# Altium schematic symbol library mastermind.SCHLIB: 732 symbols (part 2 of 5)
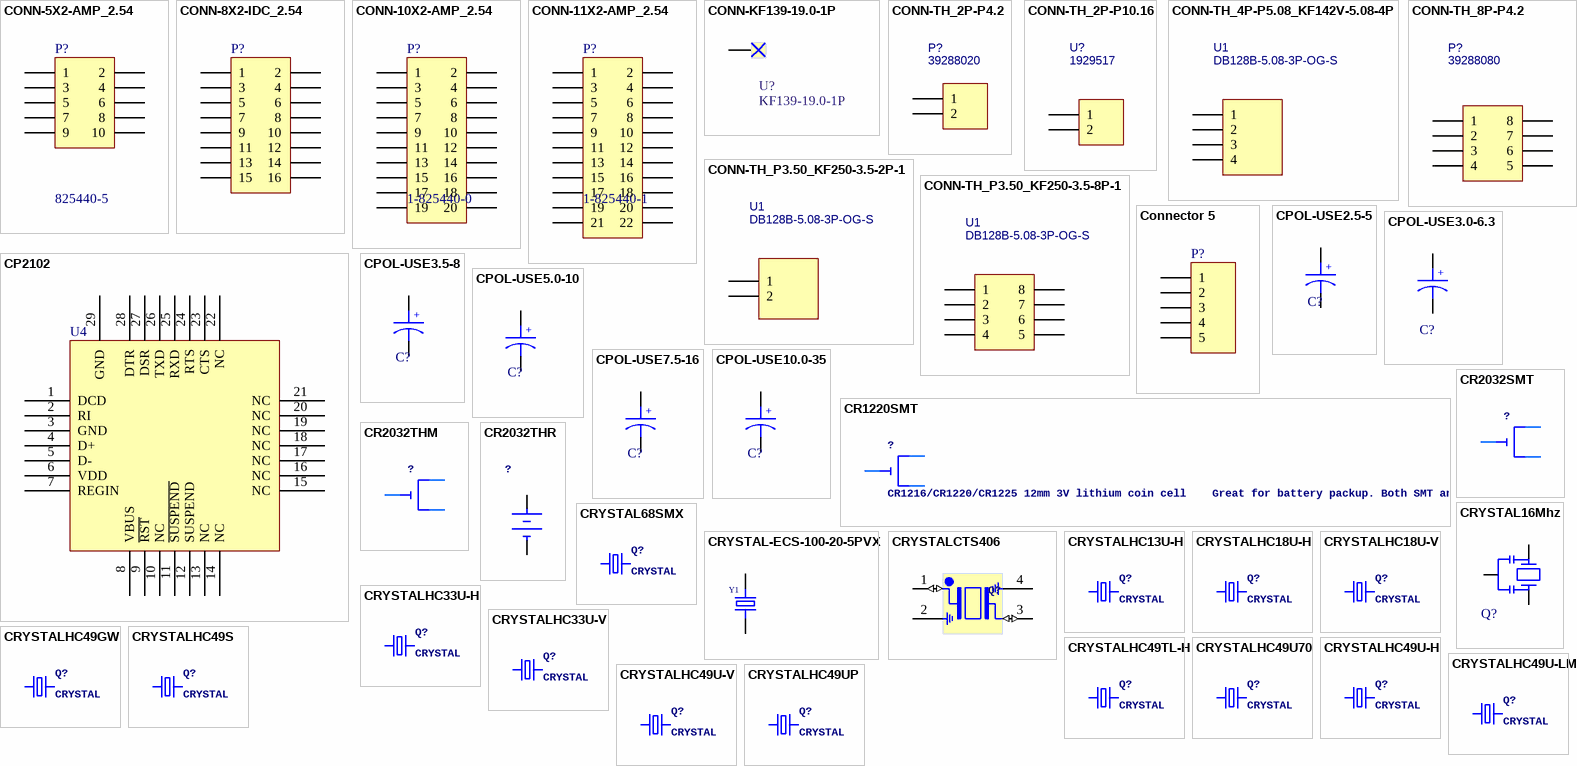
[diagram p35: symbols CONN-5X2-AMP_2.54 to CRYSTALHC49UP]

## CONN-TH_4P-P5.08_KF142V-5.08-4P
designator U1, comment DB128B-5.08-3P-OG-S
BOM_Manufacturer: DIBO; Contributor: LCSC; BOM_Supplier: LCSC; BOM_Supplier Part: C500034; BOM_Manufacturer Part: DB128B-5.08-3P-OG-S; BOM_JLCPCB Part Class: Extended Part; spicePre: U; spiceSymbolName: DB128B-5.08-3P-OG-S
footprint CONN-TH_4P-P5.08_KF142V-5.08-4P
pins: 1, 2, 3, 4

## CONN-TH_8P-P4.2
designator P?, comment 39288080
Molex POW CONN; Contributor: LCSC; Supplier: LCSC; Supplier Part: C505059; Manufacturer: MOLEX; Manufacturer Part: 39288080; JLCPCB Part Class: Extended Part; spicePre: C; spiceSymbolName: 39288080
footprint CONN-TH_39288080
pins: 1, 2, 3, 4, 5, 6, 7, 8

## CONN-TH_P3.50_KF250-3.5-2P-1
designator U1, comment DB128B-5.08-3P-OG-S
BOM_Manufacturer: DIBO; Contributor: LCSC; BOM_Supplier: LCSC; BOM_Supplier Part: C500034; BOM_Manufacturer Part: DB128B-5.08-3P-OG-S; BOM_JLCPCB Part Class: Extended Part; spicePre: U; spiceSymbolName: DB128B-5.08-3P-OG-S
footprint CONN-TH_P3.50_KF250-3.5-2P-1
pins: 1, 2

## CONN-TH_P3.50_KF250-3.5-8P-1
designator U1, comment DB128B-5.08-3P-OG-S
BOM_Manufacturer: DIBO; Contributor: LCSC; BOM_Supplier: LCSC; BOM_Supplier Part: C500034; BOM_Manufacturer Part: DB128B-5.08-3P-OG-S; BOM_JLCPCB Part Class: Extended Part; spicePre: U; spiceSymbolName: DB128B-5.08-3P-OG-S
footprint CONN-TH_8P-P2.54_KF141V-2.54-8P
pins: 1, 2, 3, 4, 5, 6, 7, 8

## Connector 5
designator P?
XH Header Male Pin 0.100; LatestRevisionDate: 17-Jul-2002; LatestRevisionNote: Re-released for DXP Platform.; Publisher: Altium Limited; JLCPCB#: C146121
signal-integrity model Connector
footprint JST-5-PTH-KIT
footprint JST-5-PTH-ST
footprint JST-5-PTH-KIT - SMD
pins: 1, 2, 3, 4, 5

## CP2102
designator U4
CP2102
footprint QFN28
pins: 1 DCD, 2 RI, 3 GND, 4 D+, 5 D-, 6 VDD, 7 REGIN, 8 VBUS, 9 ~{RST}, 10 NC, 11 ~{SUSPEND}, 12 SUSPEND, 13 NC, 14 NC, 15 NC, 16 NC, 17 NC, 18 NC, 19 NC, 20 NC, 21 NC, 22 NC, 23 CTS, 24 RTS, 25 RXD, 26 TXD, 27 DSR, 28 DTR, 29 GND

## CPOL-USE2.5-5
designator C?, comment 47uF  (value not drawn)
footprint E2,5-5
pins: +, -

## CPOL-USE3.0-6.3
designator C?, comment 47uF  (value not drawn)
footprint E2,5-6.3
pins: +, -

## CPOL-USE3.5-8
designator C?, comment 1000Uf  (value not drawn)
footprint E3,5-8
footprint E3,17-8 -NoOutline
pins: +, -

## CPOL-USE5.0-10
designator C?, comment 10uF  (value not drawn)
footprint E3,5-10
pins: +, -

## CPOL-USE7.5-16
designator C?, comment 10uF  (value not drawn)
footprint E7.5-16
pins: +, -

## CPOL-USE10.0-35
designator C?, comment 10uF  (value not drawn)
footprint E10-35
footprint E10-35-Generic
pins: +, -

## CR1220SMT
designator ?, comment CR1216/CR1220/CR1225 12mm 3V lithium coin cell    Great for battery packup. Both SMT and THM holders.  Note the THM package has the ground pads on both sides of the PCB so that the masks are the same - this reduces the cost
footprint CR1220-SMD
pins: +$1 +, +$2 +1, -

## CR2032SMT
designator ?
footprint CR2032-SMD
pins: +$1 +, +$2 +1, -

## CR2032THM
designator ?
footprint CR2032-THRU
footprint CR2032_HOLDER_SMD
pins: +, +, -

## CR2032THR
designator ?
footprint CR2032_HOLDER_SMD
footprint CR2032-THRUHOLE
pins: +, -

## CRYSTAL16Mhz
designator Q?, comment 16MHz  (value not drawn)
Crystal Osscilator; OC_FARNELL: unknown; OC_NEWARK: unknown
footprint CSTCE16M 3215
pins: 1, 2, 3

## CRYSTAL68SMX
designator Q?, comment CRYSTAL
OC_FARNELL: 6344860; OC_NEWARK: unknown
footprint 86SMX
pins: 1, 4 2

## CRYSTAL-ECS-100-20-5PVX
designator Y1, comment crystal  (value not drawn)
10MHz Â±30ppm Crystal 20pF 60 Ohms HC-49/US; MP: ECS-100-20-5PVX; MF: ECS Inc.; Availability: Warning; SnapEDA_Link: https://www.snapeda.com/parts/ECS-100-20-5PVX/ECS%20Inc./view-part/2721546/?ref=snap; Value: *; Price: None; Package: HC49/US ECS International; Check_prices: https://www.snapeda.com/parts/ECS-100-20-5PVX/ECS%20Inc./view-part/2721546/?ref=eda
footprint HC-49US_L11.5-W4.5-P4.88
footprint OSC-SMD_2P-L5.0-W3.2
footprint XTAL1
pins: 1, 2

## CRYSTALCTS406
designator Q?, comment CRYSTAL  (value not drawn)
CRYSTALCTS406; OC_FARNELL: unknown; OC_NEWARK: unknown; Parameter 1: *
footprint 3225
footprint CRYSTAL-SMD_4P-L3.2-W2.5-BL-2
footprint OSC-SMD_4P-L2.0-W1.6-BL
footprint CRYSTAL-SMD_4P-L2.5-W2.0-BL-A
pins: 1 IN (io), 2 GND, 3 OUT (io), 4 GND

## CRYSTALHC13U-H
designator Q?, comment CRYSTAL
OC_FARNELL: unknown; OC_NEWARK: unknown
footprint HC13U-H
pins: 1, 2

## CRYSTALHC18U-H
designator Q?, comment CRYSTAL
OC_FARNELL: unknown; OC_NEWARK: unknown
footprint HC18U-H
pins: 1, 2

## CRYSTALHC18U-V
designator Q?, comment CRYSTAL
OC_FARNELL: unknown; OC_NEWARK: unknown
footprint HC18U-V
pins: 1, 2

## CRYSTALHC33U-H
designator Q?, comment CRYSTAL
OC_FARNELL: unknown; OC_NEWARK: unknown
footprint HC33U-H
pins: 1, 2

## CRYSTALHC33U-V
designator Q?, comment CRYSTAL
OC_FARNELL: unknown; OC_NEWARK: unknown
footprint HC33U-V
pins: 1, 2

## CRYSTALHC49GW
designator Q?, comment CRYSTAL
OC_FARNELL: unknown; OC_NEWARK: unknown
footprint HC49GW
pins: 1, 2

## CRYSTALHC49S
designator Q?, comment CRYSTAL
OC_FARNELL: 1667008; OC_NEWARK: unknown
footprint HC49/S
pins: 1, 2

## CRYSTALHC49TL-H
designator Q?, comment CRYSTAL
OC_FARNELL: unknown; OC_NEWARK: unknown
footprint HC49TL-H
pins: 1, 2

## CRYSTALHC49U70
designator Q?, comment CRYSTAL
OC_FARNELL: unknown; OC_NEWARK: unknown
footprint HC49U70
pins: 1, 2

## CRYSTALHC49U-H
designator Q?, comment CRYSTAL
OC_FARNELL: 1666973; OC_NEWARK: unknown
footprint HC49U-H
pins: 1, 2

## CRYSTALHC49U-LM
designator Q?, comment CRYSTAL
OC_FARNELL: 1666956; OC_NEWARK: unknown
footprint HC49U-LM
pins: 1, 2

## CRYSTALHC49U-V
designator Q?, comment CRYSTAL
OC_FARNELL: 1666969; OC_NEWARK: unknown
footprint HC49U-V
pins: 1, 2

## CRYSTALHC49UP
designator Q?, comment CRYSTAL
OC_FARNELL: unknown; OC_NEWARK: unknown
footprint HC49UP
pins: 1, 2

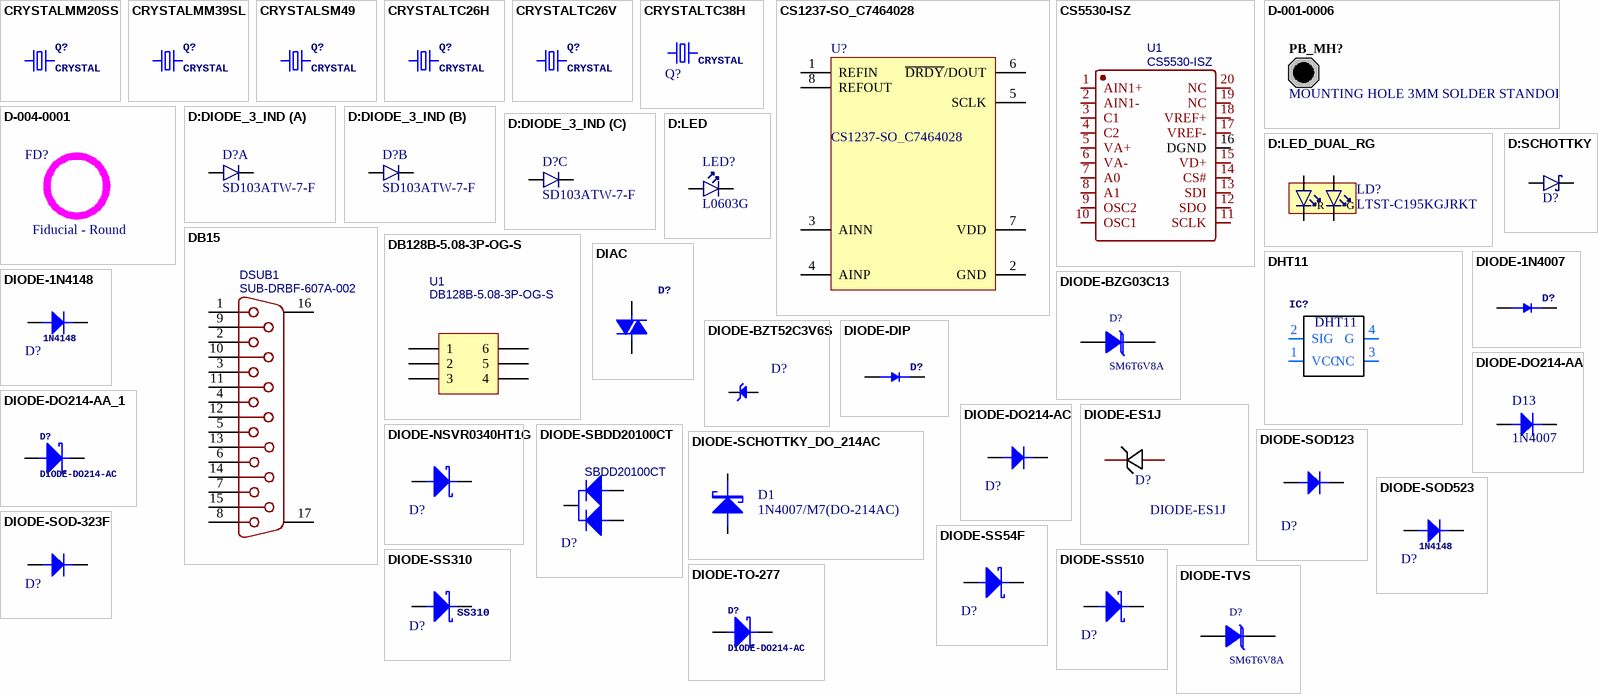
[diagram p9: symbols CRYSTALMM20SS to DIODE-TVS]

## CRYSTALMM20SS
designator Q?, comment CRYSTAL
OC_FARNELL: unknown; OC_NEWARK: unknown
footprint MM20SS
pins: 1, 4 2

## CRYSTALMM39SL
designator Q?, comment CRYSTAL
OC_FARNELL: unknown; OC_NEWARK: unknown
footprint MM39SL
pins: 1, 4 2

## CRYSTALSM49
designator Q?, comment CRYSTAL
OC_FARNELL: unknown; OC_NEWARK: unknown
footprint SM49
pins: 1, 2

## CRYSTALTC26H
designator Q?, comment CRYSTAL
OC_FARNELL: unknown; OC_NEWARK: unknown
footprint TC26H
pins: 1, 2

## CRYSTALTC26V
designator Q?, comment CRYSTAL
OC_FARNELL: unknown; OC_NEWARK: unknown
footprint TC26V
pins: 1, 2

## CRYSTALTC38H
designator Q?, comment CRYSTAL
OC_FARNELL: unknown; OC_NEWARK: unknown
footprint TC38H
footprint TC38H - SMD
pins: 1, 2

## CS1237-SO_C7464028
designator U?
CS1237 24-Bit High Precision ADC with Delta-Sigma Modulator; Manufacturer: CHIPSEA(芯海科技); Contributor: lcsc; Supplier: LCSC; Supplier Part: C7464028; Manufacturer Part: CS1237-SO; JLCPCB Part Class: Extended Part; spicePre: U; spiceSymbolName: CS1237-SO_C7464028
footprint SOIC-8E (SOIC, 8-Leads, Body 4.90x3.90mm, Pitch 1.27mm, IPC Medium Density)
pins: 1 REFIN, 2 GND, 3 AINN, 4 AINP, 5 SCLK, 6 ~{DRDY}/DOUT, 7 VDD, 8 REFOUT

## CS5530-ISZ
designator U1
BOM_Manufacturer: Cirrus Logic(凌云); spicePre: X; BOM_Manufacturer Part: CS5530-ISZ; BOM_Supplier: LCSC; BOM_Supplier Part: C9929; BOM_JLCPCB Part Class: Extended Part; spiceSymbolName: CS5530-ISZ
footprint SSOP-20_L7.2-W5.3-P0.65-LS7.8-BL
pins: 1 AIN1+, 2 AIN1-, 3 C1, 4 C2, 5 VA+, 6 VA-, 7 A0, 8 A1, 9 OSC2, 10 OSC1, 11 SCLK, 12 SDO, 13 SDI, 14 CS#, 15 VD+, 16 DGND, 17 VREF-, 18 VREF+, 19 NC, 20 NC

## D-001-0006
designator PB_MH?, comment MOUNTING HOLE 3MM SOLDER STANDOFF  (no BOM)
Mounting Hole for Solder Standoff, M3 Screw, Plated, Round Pad; Category: Mounting-Hole; Status: Production
footprint STANDOFF_SOLDER_3MM
pins: 1 hidden

## D-004-0001
designator FD?, comment Fiducial - Round
Fiducial - Round 1.5mm Top-Bottom; Status: Unreleased; Category: Fiducial
footprint FIDUCIAL ROUND

## D:DIODE_3_IND
designator D?, comment SD103ATW-7-F
Surface Mount Schottky Barrier Diode Array; Manufacturer: Diodes Incorporated; 2nd source part number: 177-3507; Artikkelnr Noca: 10029109; Artikkelnr Simpro: N.A.; Part Number: SD103ATW-7-F; Manufacturer Part Number: SD103ATW-7-F; Datasheet: http://www.diodes.com/datasheets/ds30374.pdf; LatestRevisionDate: 2012-06-15; Publisher: Nordic Semiconductor; Published: 2012-06-15; Value: SD103ATW-7-F; Note: *; Supplier: Digi-Key; Supplier part number: SD103ATW-FDITR-ND; 2nd source Supplier: Farnell; Footprint Doc: SOT-363
footprint SOT-363
part A pins: 1 C1, 6 A1
part B pins: 2 C2, 5 A2
part C pins: 3 C3, 4 A3

## D:LED
designator LED?, comment L0603G
LED SMARTLED GREEN 570NM 0603; Part Number: LG L29K Smartled Green; Manufacturer: Multicomp; Manufacturer Part Number: LG L29K-G2J1-24-Z; Note: 2,24..5.6 mcd, Vfmin=1.7V; Artikkelnr Noca: N.A.; Datasheet: http://www.osram-os.com/Graphics/XPic2/00077107_0.pdf; Footprint Doc: 0603; LatestRevisionDate: 2014-10-28; Pin Count: 2; Publisher: Nordic Semiconductor; Published: 2014-10-28; Value: L0603G; Supplier: Digi-Key; Supplier part number: 475-2709-1-ND; 2nd source Supplier: *; 2nd source part number: *; Artikkelnr Simpro: N.A.
footprint LED_0603_G
pins: 1 C, 2 A

## D:LED_DUAL_RG
designator LD?, comment LTST-C195KGJRKT
Ultra bright AlInGaP Bi-Color LED; Manufacturer: Lite-On Inc; 2nd source part number: 859-LTST-C195KGJRKT; Artikkelnr Noca: 13019145; Artikkelnr Simpro: N.A.; Part Number: LTST-C195KGJRKT; Manufacturer Part Number: LTST-C195KGJRKT; Datasheet: http://media.digikey.com/pdf/Data%20Sheets/Lite-On%20PDFs/LTST-C195KGJRKT.pdf; LatestRevisionDate: 2013-02-11; Pin Count: 4; Publisher: Nordic Semiconductor; Published: 2012-07-05; Value: LTST-C195KGJRKT; Note: *; Supplier: Digi-Key; Supplier part number: 160-1452-1-ND; 2nd source Supplier: Mouser; Footprint Doc: LED_DUAL_0606
footprint LED_DUAL_0606
pins: 1 A2, 2 A1, 3 C2, 4 C1
text: R; G

## D:SCHOTTKY
designator D?, comment 1PS79SB30.115  (value not drawn)
Diode Schottky Vf=0.38, Vr=40V, If=200mA, Ir=500nA; Manufacturer: NXP; Artikkelnr Noca: N.A.; Part Number: 1PS79SB30.115; Manufacturer Part Number: 1PS79SB30.115; Datasheet: http://www.nxp.com/documents/data_sheet/1PS79SB30.pdf; Footprint Doc: SOD-523; LatestRevisionDate: 2014-09-24; Pin Count: 2; Publisher: Nordic Semiconductor; Published: 2014-09-24; Value: 1PS79SB30.115; Note: *; Supplier: Digi-Key; Supplier part number: 568-5973-1-ND; 2nd source Supplier: *; 2nd source part number: *; Artikkelnr Simpro: N.A.
footprint SOD-523
pins: A, K C

## DB15
designator DSUB1, comment SUB-DRBF-607A-002
BOM_Manufacturer: Nextron(正凌); Contributor: LCSC; BOM_Supplier: LCSC; BOM_Supplier Part: C2846090; BOM_Manufacturer Part: SUB-DRBF-607A-002; BOM_JLCPCB Part Class: Extended Part; spicePre: D; spiceSymbolName: SUB-DRBF-607A-002
footprint DSUB-TH_FDB1502-F0DB300K6KA-Female
footprint DSUB-TH_FDB1502-F0DB300K6KA-Male
pins: 1, 2, 3, 4, 5, 6, 7, 8, 9, 10, 11, 12, 13, 14, 15, 16 MH2, 17 MH1

## DB128B-5.08-3P-OG-S
designator U1
BOM_Manufacturer: DIBO; Contributor: LCSC; BOM_Supplier: LCSC; BOM_Supplier Part: C500034; BOM_Manufacturer Part: DB128B-5.08-3P-OG-S; BOM_JLCPCB Part Class: Extended Part; spicePre: U; spiceSymbolName: DB128B-5.08-3P-OG-S
footprint CONN-TH_DB128B-5.08-3P-XX-S
footprint CONN-TH_KF250T-5.0-2X3P
pins: 1, 2, 3, 4, 5, 6

## DHT11
designator IC?, comment TIMERChanged DIP package to have round (not oval) pin pads    http://www.ladyada.net/library/pcb/eaglelibrary.html
footprint DHT11
pins: 1 VCC (power), 2 SIG, 3 NC (power), 4 G

## DIAC
designator D?, comment Diac  (value not drawn)
footprint TO220DS
pins: T1 A1, T2 A2

## DIODE-1N4007
designator D?
DIODE   General purpose 1N400x type rectifier    (With bigger pads)   http://www.ladyada.net/library/pcb/eaglelibrary.html
footprint DO41-10
pins: A, C

## DIODE-1N4148
designator D?, comment 1N4148
footprint DO-1N4148
footprint DO100-AA
footprint DO-1N4148 - 10mm
pins: A, K

## DIODE-BZG03C13
designator D?, comment SM6T6V8A
Zener TVS, 6.2V, 5W; Manufacturer: Microsemi; Revision: 31-Oct-2003
footprint DO214
pins: 1 A, 2 K

## DIODE-BZT52C3V6S
designator D?, comment BZT52C3V6S/W4  (value not drawn)
Independent Type 200mW 3.6V~3.8V 3.4V SOD-323 Zener Diodes ROHS; Manufacturer: YFW(佑风微); Symbol: BZT52C3V6S_C5270767; Add into BOM: yes; Reverse Leakage Current (Ir): 5uA@1V; Zener Impedance (Zzt): 90Ω; Device: BZT52C3V6S_C5270767; LCSC Part Name: BZT52C3V6S; Manufacturer Part: BZT52C3V6S; Supplier Footprint: SOD-323; JLCPCB Part Class: Extended Part; Datasheet: https://atta.szlcsc.com/upload/public/pdf/source/20221116/07630275E16F5BD1867C326257346985.pdf; Supplier: LCSC; Convert to PCB: yes; Diode Configuration: Independent Type; Zener Voltage (Nom): 3.4V; Zener Voltage (Range): 3.6V~3.8V; Power Dissipation: 200mW; Supplier Part: C5270767
footprint SOD-323
pins: A (power), K C (power)

## DIODE-DIP
designator D?
DIODE   General purpose 1N400x type rectifier    (With bigger pads)   http://www.ladyada.net/library/pcb/eaglelibrary.html
footprint DO41-10
pins: A, C

## DIODE-DO214-AA
designator D13, comment 1N4007
SMD Diode DO214-AC
footprint DO214-AA
pins: A, C

## DIODE-DO214-AA_1
designator D?, comment DIODE-DO214-AC
Diode   SMADIODE - SMA Surface Mount Package  20V 1A Schottky Diode Digikey: 641-1014-6-ND    DO-1N4148 - Through Hole Small Current Diode SOD-123 20V 1 A (.5mV Vf) Schottky Diode - Digikey: MBRX120TPMSCT-ND    SOD-323 10V 570mA (.38mV Vf, 3ns) Schottky Diode - Digikey: ZLLS410CT-ND    SOD-523 30V 30mA Schottky Diode (RB751S-40TE61) - Digikey: RB751S-40TE61CT-ND    SOT23-R/W - SOT23 Package (R = Solder Paste/Reflow Ovens, W = Hand-Soldering)  BAT54Film 40V 300mA - Digikey: 497-7162-1-ND
footprint DO214-AA
pins: A, C

## DIODE-DO214-AC
designator D?  (value not drawn)
Designator: *
footprint DO214-AC
pins: A, C

## DIODE-ES1J
designator D?
Manufacturer: MDD(辰达半导体); Manufacturer Part: ES1J; Symbol: ES1JG_C412438; Device: ES1J_C412438; Add into BOM: yes; Forward Voltage (Vf@If): 1.7V@1A; Reverse Leakage Current: 5uA@600V; LCSC Part Name: 电压:600V 电流:1A; Supplier Part: C412438; Supplier Footprint: SMA; JLCPCB Part Class: Extended Part; Datasheet: https://atta.szlcsc.com/upload/public/pdf/source/20230314/8FCBE4D1988E86B6B35ACD92F03E7C76.pdf; Supplier: LCSC; Convert to PCB: yes; Operating Temperature: -55℃~+150℃@(Tj)
footprint SMA_L4.4-W2.8-LS5.4-RD
pins: 1 C, 2 A

## DIODE-NSVR0340HT1G
designator D?, comment NSVR0340HT1G  (value not drawn)
Schottky Diode / NSVR0340HT1G; Designator: *
footprint SOD-323
pins: A, K C

## DIODE-SBDD20100CT
designator D?, comment SBDD20100CT
Schottky Barrier Diodes; Manufacturer: CJ(江苏长电/长晶); Contributor: LCSC; Supplier: LCSC; Supplier Part: C513356; Manufacturer Part: SBDD20100CT; JLCPCB Part Class: Extended Part; spicePre: U; spiceSymbolName: SBDD20100CT
footprint TO252
pins: 1 A, 2 A, 3 K

## DIODE-SCHOTTKY_DO_214AC
designator D1, comment 1N4007/M7(DO-214AC)
Surface mount schottky diode DO-214AC(SMA) Package
footprint SMT_DIODE_DO_214AC (DO-214AC(SMA) Package)
pins: 1 A, 2 K

## DIODE-SOD123
designator D?
Schottky Diode
footprint SOD-123
footprint SOD-123HE1_L3.0-W2.0-LS3.7-RD
pins: 1 C, 2 A

## DIODE-SOD523
designator D?, comment 1N4148
footprint SOD-523
pins: A, K C

## DIODE-SOD-323F
designator D?, comment Diode   SMADIODE - SMA Surface Mount Package  20V 1A Schottky Diode Digikey: 641-1014-6-ND    DO-1N4148 - Through Hole Small Current Diode SOD-123 20V 1 A (.5mV Vf) Schottky Diode - Digikey: MBRX120TPMSCT-ND    SOD-323 10V 570mA (.38mV Vf, 3ns) Schottky Diode - Digikey: ZLLS410CT-ND    SOD-523 30V 30mA Schottky Diode (RB751S-40TE61) - Digikey: RB751S-40TE61CT-ND    SOT23-R/W - SOT23 Package (R = Solder Paste/Reflow Ovens, W = Hand-Soldering)  BAT54Film 40V 300mA - Digikey: 497-7162-1-ND  (value not drawn)
Parameter 1: *
footprint SOD-323
pins: A, K C

## DIODE-SS54F
designator D?, comment DIODE-DO214-AC  (value not drawn)
Schottky Diode; Designator: *
footprint DO214-AC
pins: A, C

## DIODE-SS310
designator D?, comment SS310
Schottky Diode
footprint DO214A
pins: 1 A, 2 C

## DIODE-SS510
designator D?, comment SS510  (value not drawn)
Schottky Diode; Designator: *
footprint SMC_L7.1-W6.2-LS8.1-RD
pins: 1 C, 2 A

## DIODE-TO-277
designator D?, comment DIODE-DO214-AC
Schottky Diode
footprint TO-277
pins: A, C

## DIODE-TVS
designator D?, comment SM6T6V8A
Tvs Diode, 6.2V, 5W; Manufacturer: Microsemi; Revision: 31-Oct-2003
footprint DO214
pins: 1 A, 2 K

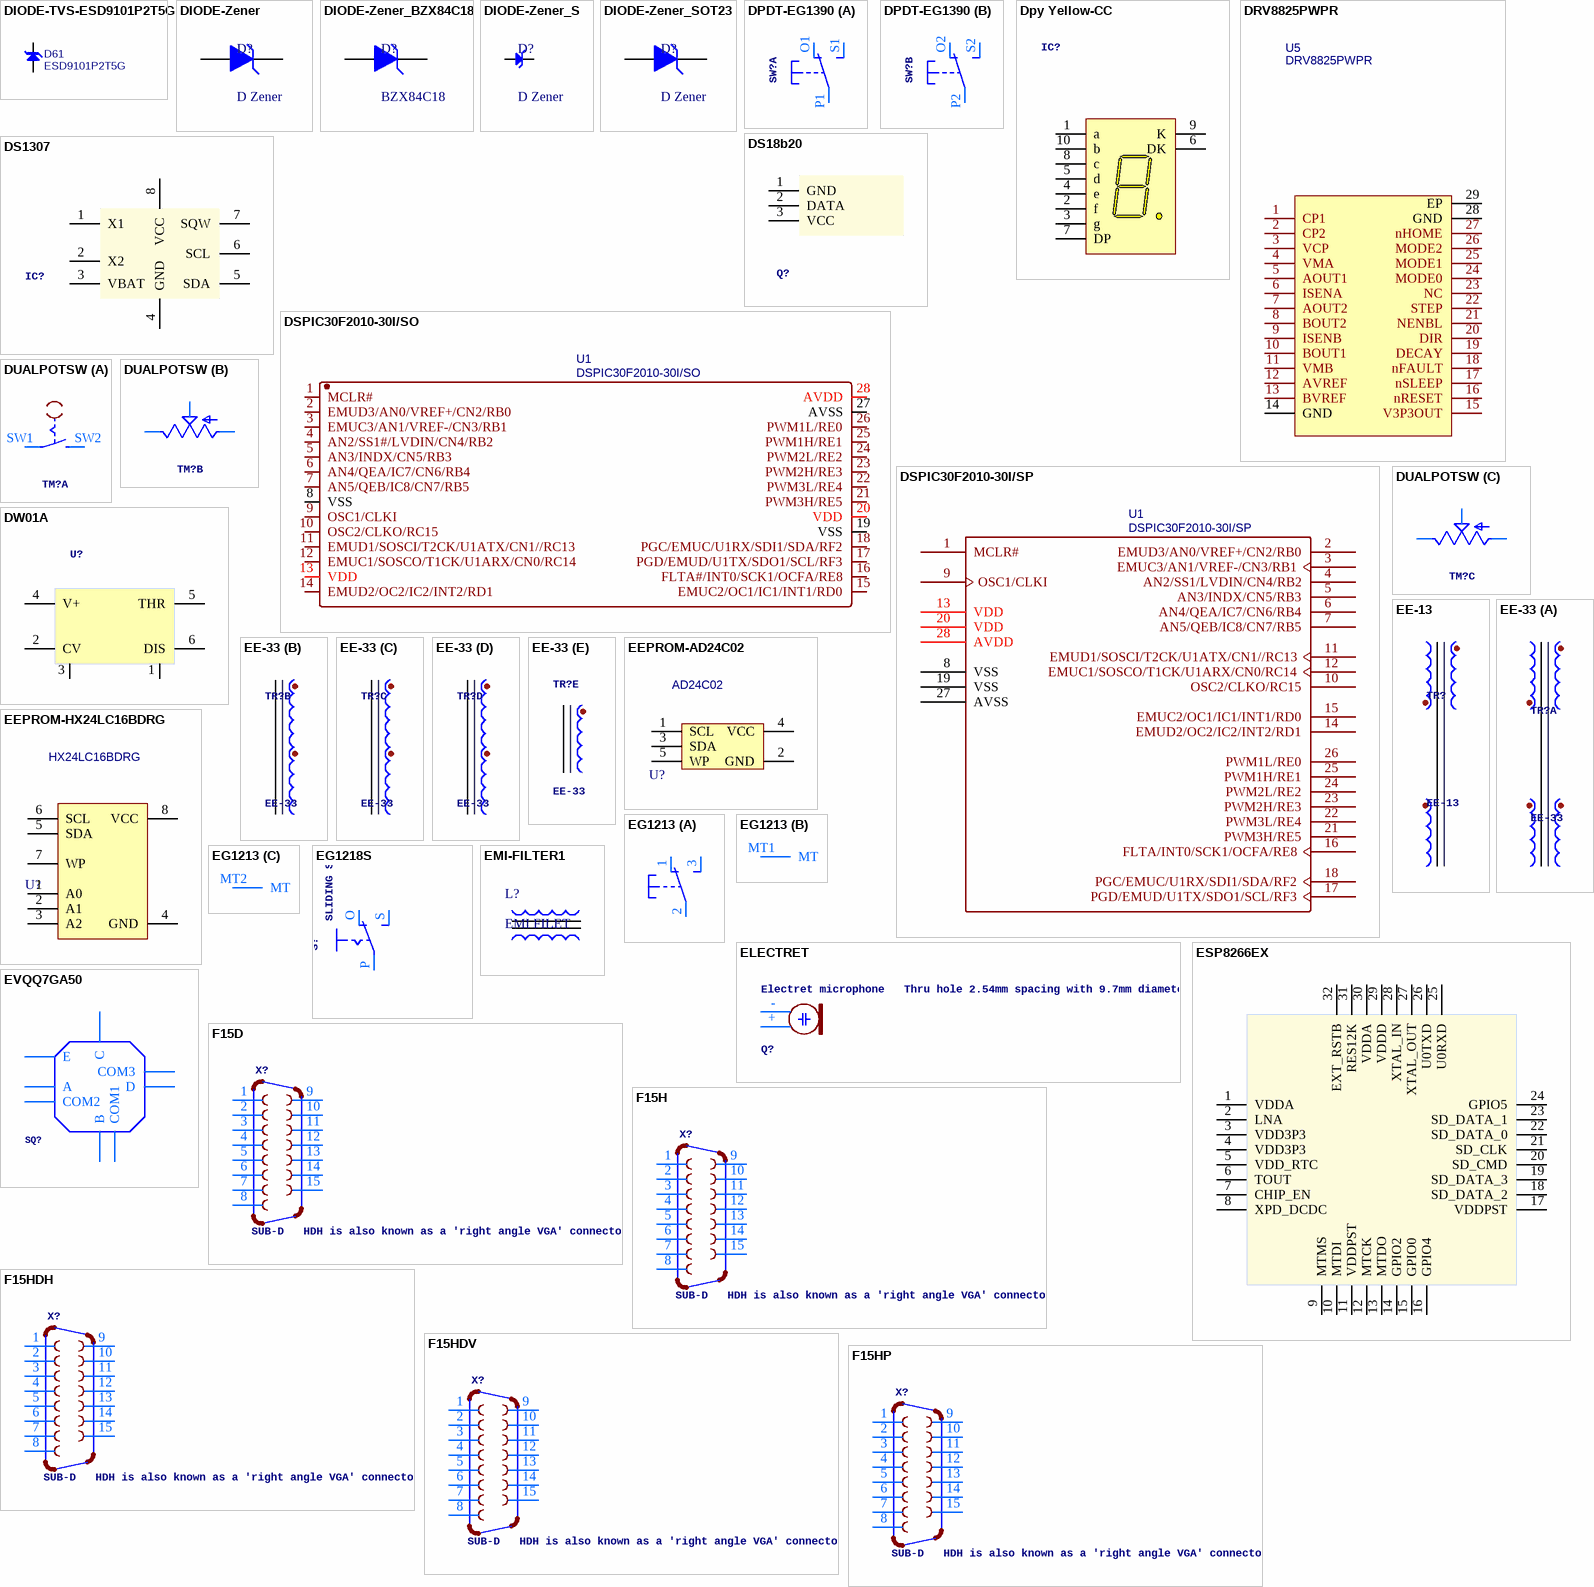
[diagram p10: symbols DIODE-TVS-ESD9101P2T5G to F15HP]

## DIODE-TVS-ESD9101P2T5G
designator D61, comment ESD9101P2T5G
ESD Protection Diode; Manufacturer Name: OnSemi; Manufacturer Part No.: ESD9101P2T5G
footprint SOD-923 (SOD-923, 2-Leads, Body 0.60x1.00mm, IPC Medium Density)
pins: 1 C (power), 2 A (power)

## DIODE-Zener
designator D?, comment D Zener
Zener Diode; Published: 8-Jun-2000; LatestRevisionDate: 17-Jul-2002; LatestRevisionNote: Re-released for DXP Platform.; PackageReference: DIODE-0.7; Publisher: Altium Limited; PackageDescription: Diode, Thru-Hole; 2 Leads; 0.7 in Pin Spacing
simulation model ZENER (Diode)
signal-integrity model D Zener
footprint SOD-323
footprint DO100-AA
footprint DO-1N4148
footprint DO-1N4148 - 10mm
footprint SOD-123HE1_L3.0-W2.0-LS3.7-RD - KA
pins: A, K

## DIODE-Zener_BZX84C18
designator D?, comment BZX84C18
Zener Diode 18V; Published: 8-Jun-2000; LatestRevisionDate: 17-Jul-2002; LatestRevisionNote: Re-released for DXP Platform.; PackageReference: DIODE-0.7; Publisher: Altium Limited; PackageDescription: Diode, Thru-Hole; 2 Leads; 0.7 in Pin Spacing
footprint SOT23; pin to pad 1>1+2
pins: 1 A, 3 K

## DIODE-Zener_S
designator D?, comment D Zener
Zener Diode, Vz=15V, 300mW; Published: 8-Jun-2000; LatestRevisionDate: 17-Jul-2002; LatestRevisionNote: Re-released for DXP Platform.; PackageReference: DIODE-0.7; Publisher: Altium Limited; PackageDescription: Diode, Thru-Hole; 2 Leads; 0.7 in Pin Spacing
simulation model ZENER (Diode)
signal-integrity model D Zener
footprint SOD-323
pins: A (power), K C (power)

## DIODE-Zener_SOT23
designator D?, comment D Zener
Zener Diode; Published: 8-Jun-2000; LatestRevisionDate: 17-Jul-2002; LatestRevisionNote: Re-released for DXP Platform.; PackageReference: DIODE-0.7; Publisher: Altium Limited; PackageDescription: Diode, Thru-Hole; 2 Leads; 0.7 in Pin Spacing
footprint SOT23
pins: 1 A, 3 K

## DPDT-EG1390
designator SW?
footprint EG1390
part A pins: O1 O, P1 P, S1 S
part B pins: O2 O, P2 P, S2 S

## Dpy Yellow-CC
designator IC?, comment TIMERChanged DIP package to have round (not oval) pin pads    http://www.ladyada.net/library/pcb/eaglelibrary.html  (value not drawn)
footprint 7-Segment
pins: 1 a "Anode", 2 f "Anode", 3 g "Anode", 4 e "Anode", 5 d "Anode", 6 DK "Cathode", 7 DP "Anode", 8 c "Anode", 9 K "Cathode", 10 b "Anode"

## DRV8825PWPR
designator U5
BOM_Manufacturer: TI(德州仪器); BOM_Supplier: LCSC; BOM_Manufacturer Part: DRV8825PWPR; BOM_Supplier Part: C81582; BOM_JLCPCB Part Class: Extended Part; spicePre: U; spiceSymbolName: DRV8825PWPR
footprint HTSSOP-28_L9.7-W4.4-P0.65-LS6.4-BL-EP
pins: 1 CP1, 2 CP2, 3 VCP, 4 VMA, 5 AOUT1, 6 ISENA, 7 AOUT2, 8 BOUT2, 9 ISENB, 10 BOUT1, 11 VMB, 12 AVREF, 13 BVREF, 14 GND, 15 V3P3OUT, 16 nRESET, 17 nSLEEP, 18 nFAULT, 19 DECAY, 20 DIR, 21 NENBL, 22 STEP, 23 NC, 24 MODE0, 25 MODE1, 26 MODE2, 27 nHOME, 28 GND, 29 EP

## DS18b20
designator Q?
Dellas temperature sensor
footprint TO92-INLINE
pins: 1 GND, 2 DATA, 3 VCC

## DS1307
designator IC?, comment DS1307   Real time clock (RTC) with battery backup ability. Talk to it via i2c  (value not drawn)
footprint DIL08
footprint SOP8
pins: 1 X1, 2 X2, 3 VBAT, 4 GND, 5 SDA, 6 SCL, 7 SQW (power), 8 VCC (power)

## DSPIC30F2010-30I/SO
designator U1
Manufacturer: MICROCHIP(美国微芯); Supplier: LCSC; Manufacturer Part: DSPIC30F2010-30I/SO; Supplier Part: C9797; JLCPCB Part Class: Extended Part; spicePre: U; spiceSymbolName: DSPIC30F2010-30I/SO
footprint SOIC-28_L18.0-W7.5-P1.27-LS10.3-BL
pins: 1 MCLR#, 2 EMUD3/AN0/VREF+/CN2/RB0, 3 EMUC3/AN1/VREF-/CN3/RB1, 4 AN2/SS1#/LVDIN/CN4/RB2, 5 AN3/INDX/CN5/RB3, 6 AN4/QEA/IC7/CN6/RB4, 7 AN5/QEB/IC8/CN7/RB5, 8 VSS, 9 OSC1/CLKI, 10 OSC2/CLKO/RC15, 11 EMUD1/SOSCI/T2CK/U1ATX/CN1//RC13, 12 EMUC1/SOSCO/T1CK/U1ARX/CN0/RC14, 13 VDD, 14 EMUD2/OC2/IC2/INT2/RD1, 15 EMUC2/OC1/IC1/INT1/RD0, 16 FLTA#/INT0/SCK1/OCFA/RE8, 17 PGD/EMUD/U1TX/SDO1/SCL/RF3, 18 PGC/EMUC/U1RX/SDI1/SDA/RF2, 19 VSS, 20 VDD, 21 PWM3H/RE5, 22 PWM3L/RE4, 23 PWM2H/RE3, 24 PWM2L/RE2, 25 PWM1H/RE1, 26 PWM1L/RE0, 27 AVSS, 28 AVDD

## DSPIC30F2010-30I/SP
designator U1
Manufacturer: MICROCHIP(美国微芯); Supplier: LCSC; Manufacturer Part: DSPIC30F2010-30I/SP; Supplier Part: C134088; JLCPCB Part Class: Extended Part; spicePre: U; spiceSymbolName: DSPIC30F2010-30I/SP
footprint DIP-28_L34.6-W7.3-P2.54-LS10.2-BL
pins: 1 MCLR#, 2 EMUD3/AN0/VREF+/CN2/RB0, 3 EMUC3/AN1/VREF-/CN3/RB1, 4 AN2/SS1/LVDIN/CN4/RB2, 5 AN3/INDX/CN5/RB3, 6 AN4/QEA/IC7/CN6/RB4, 7 AN5/QEB/IC8/CN7/RB5, 8 VSS, 9 OSC1/CLKI, 10 OSC2/CLKO/RC15, 11 EMUD1/SOSCI/T2CK/U1ATX/CN1//RC13, 12 EMUC1/SOSCO/T1CK/U1ARX/CN0/RC14, 13 VDD, 14 EMUD2/OC2/IC2/INT2/RD1, 15 EMUC2/OC1/IC1/INT1/RD0, 16 FLTA/INT0/SCK1/OCFA/RE8, 17 PGD/EMUD/U1TX/SDO1/SCL/RF3, 18 PGC/EMUC/U1RX/SDI1/SDA/RF2, 19 VSS, 20 VDD, 21 PWM3H/RE5, 22 PWM3L/RE4, 23 PWM2H/RE3, 24 PWM2L/RE2, 25 PWM1H/RE1, 26 PWM1L/RE0, 27 AVSS, 28 AVDD

## DUALPOTSW
designator TM?
footprint RK0971221
part A pins: SW1 P, SW2 S
part B pins: A2 E, B2 A, W2 S
part C pins: A1 E, B1 A, W1 S

## DW01A
designator U?
footprint SOT23-6
pins: 1 TR, 2 CV, 3 GND (power), 4 V+ (power), 5 THR, 6 DIS

## EE-13
designator TR?
TRANSFORMER   1 primary winding, 2 secondary windings   ERA
footprint EE13
footprint EE13 - thx208
pins: 1, 2, 3, 4, 5, 6

## EE-33
designator TR?
EI33 EE33 18+18pin Vertical Transfomer Bobbin+PC40 ferrite core
footprint EE33
part A pins: 1 NC hidden to GND, 2 NC hidden to GND, 3 NC hidden to GND, 13, 14, 15, 16, 19, 20, 21 NC hidden to GND, 22, 23
part B pins: 4, 5, 6
part C pins: 7, 8, 9
part D pins: 10, 11, 12
part E pins: 17, 18

## EEPROM-AD24C02
designator U?, comment AD24C02
Manufacturer: IDCHIP(英锐芯); Contributor: lcsc; Supplier: LCSC; Supplier Part: C5125083; Manufacturer Part: AD24C02; JLCPCB Part Class: Extended Part; spicePre: U; spiceSymbolName: AD24C02
footprint SOT23-5L
pins: 1 SCL, 2 GND, 3 SDA, 4 VCC, 5 WP

## EEPROM-HX24LC16BDRG
designator U?, comment HX24LC16BDRG
EEPROM; Manufacturer: HGC(深圳汉芯); Contributor: lcsc; Supplier: LCSC; Supplier Part: C2987259; Manufacturer Part: HX24LC16BDRG; JLCPCB Part Class: Extended Part; spicePre: U; spiceSymbolName: HX24LC16BDRG
footprint SOIC-8_L4.9-W3.9-P1.27-LS6.0-BL
footprint SOIC-8E (SOIC, 8-Leads, Body 4.90x3.90mm, Pitch 1.27mm, IPC Medium Density)
pins: 1 A0, 2 A1, 3 A2, 4 GND, 5 SDA, 6 SCL, 7 WP, 8 VCC

## EG1213
designator S?, comment E-Switch right-angle slide SPDT Part #EG1213    http://www.ladyada.net/library/eagle  (value not drawn)
footprint EG1213
part A pins: 1 O, 2 P, 3 S
part B pins: MT1 MT
part C pins: MT2 MT

## EG1218S
designator S?, comment SLIDING SWITCH   0.1" spacing through hole, vertical SPDT slide switch    http://www.ladyada.net/library/pcb/eaglelibrary.html
footprint EG1218
pins: O, P, S

## ELECTRET
designator Q?, comment Electret microphone   Thru hole 2.54mm spacing with 9.7mm diameter
footprint 9.7ELECTRET
pins: + 2, - 1

## EMI-FILTER1
designator L?, comment EMI FILET
Common Mode Noise Filter
footprint FIL_DLW5BTM501SQ2L
footprint FIL_CoreXX
footprint FIL_Z0021A
pins: 1, 2, 3, 4

## ESP8266EX
designator X?
footprint QFN32
pins: 1 VDDA, 2 LNA, 3 VDD3P3, 4 VDD3P3, 5 VDD_RTC, 6 TOUT, 7 CHIP_EN, 8 XPD_DCDC, 9 MTMS, 10 MTDI, 11 VDDPST, 12 MTCK, 13 MTDO, 14 GPIO2, 15 GPIO0, 16 GPIO4, 17 VDDPST, 18 SD_DATA_2, 19 SD_DATA_3, 20 SD_CMD, 21 SD_CLK, 22 SD_DATA_0, 23 SD_DATA_1, 24 GPIO5, 25 U0RXD, 26 U0TXD, 27 XTAL_OUT, 28 XTAL_IN, 29 VDDD, 30 VDDA, 31 RES12K, 32 EXT_RSTB

## EVQQ7GA50
designator SQ?
footprint EVQQ7GA50
pins: A, B, C, COM1, COM2, COM3, D, E

## F15D
designator X?, comment SUB-D   HDH is also known as a 'right angle VGA' connector
footprint F15D
pins: 1, 2, 3, 4, 5, 6, 7, 8, 9, 10, 11, 12, 13, 14, 15

## F15H
designator X?, comment SUB-D   HDH is also known as a 'right angle VGA' connector
footprint F15H
pins: 1, 2, 3, 4, 5, 6, 7, 8, 9, 10, 11, 12, 13, 14, 15

## F15HDH
designator X?, comment SUB-D   HDH is also known as a 'right angle VGA' connector
footprint HDF15H
pins: 1, 2, 3, 4, 5, 6, 7, 8, 9, 10, 11, 12, 13, 14, 15

## F15HDV
designator X?, comment SUB-D   HDH is also known as a 'right angle VGA' connector
footprint HDF15V
pins: 1, 2, 3, 4, 5, 6, 7, 8, 9, 10, 11, 12, 13, 14, 15

## F15HP
designator X?, comment SUB-D   HDH is also known as a 'right angle VGA' connector
footprint F15HP
pins: 1, 2, 3, 4, 5, 6, 7, 8, 9, 10, 11, 12, 13, 14, 15

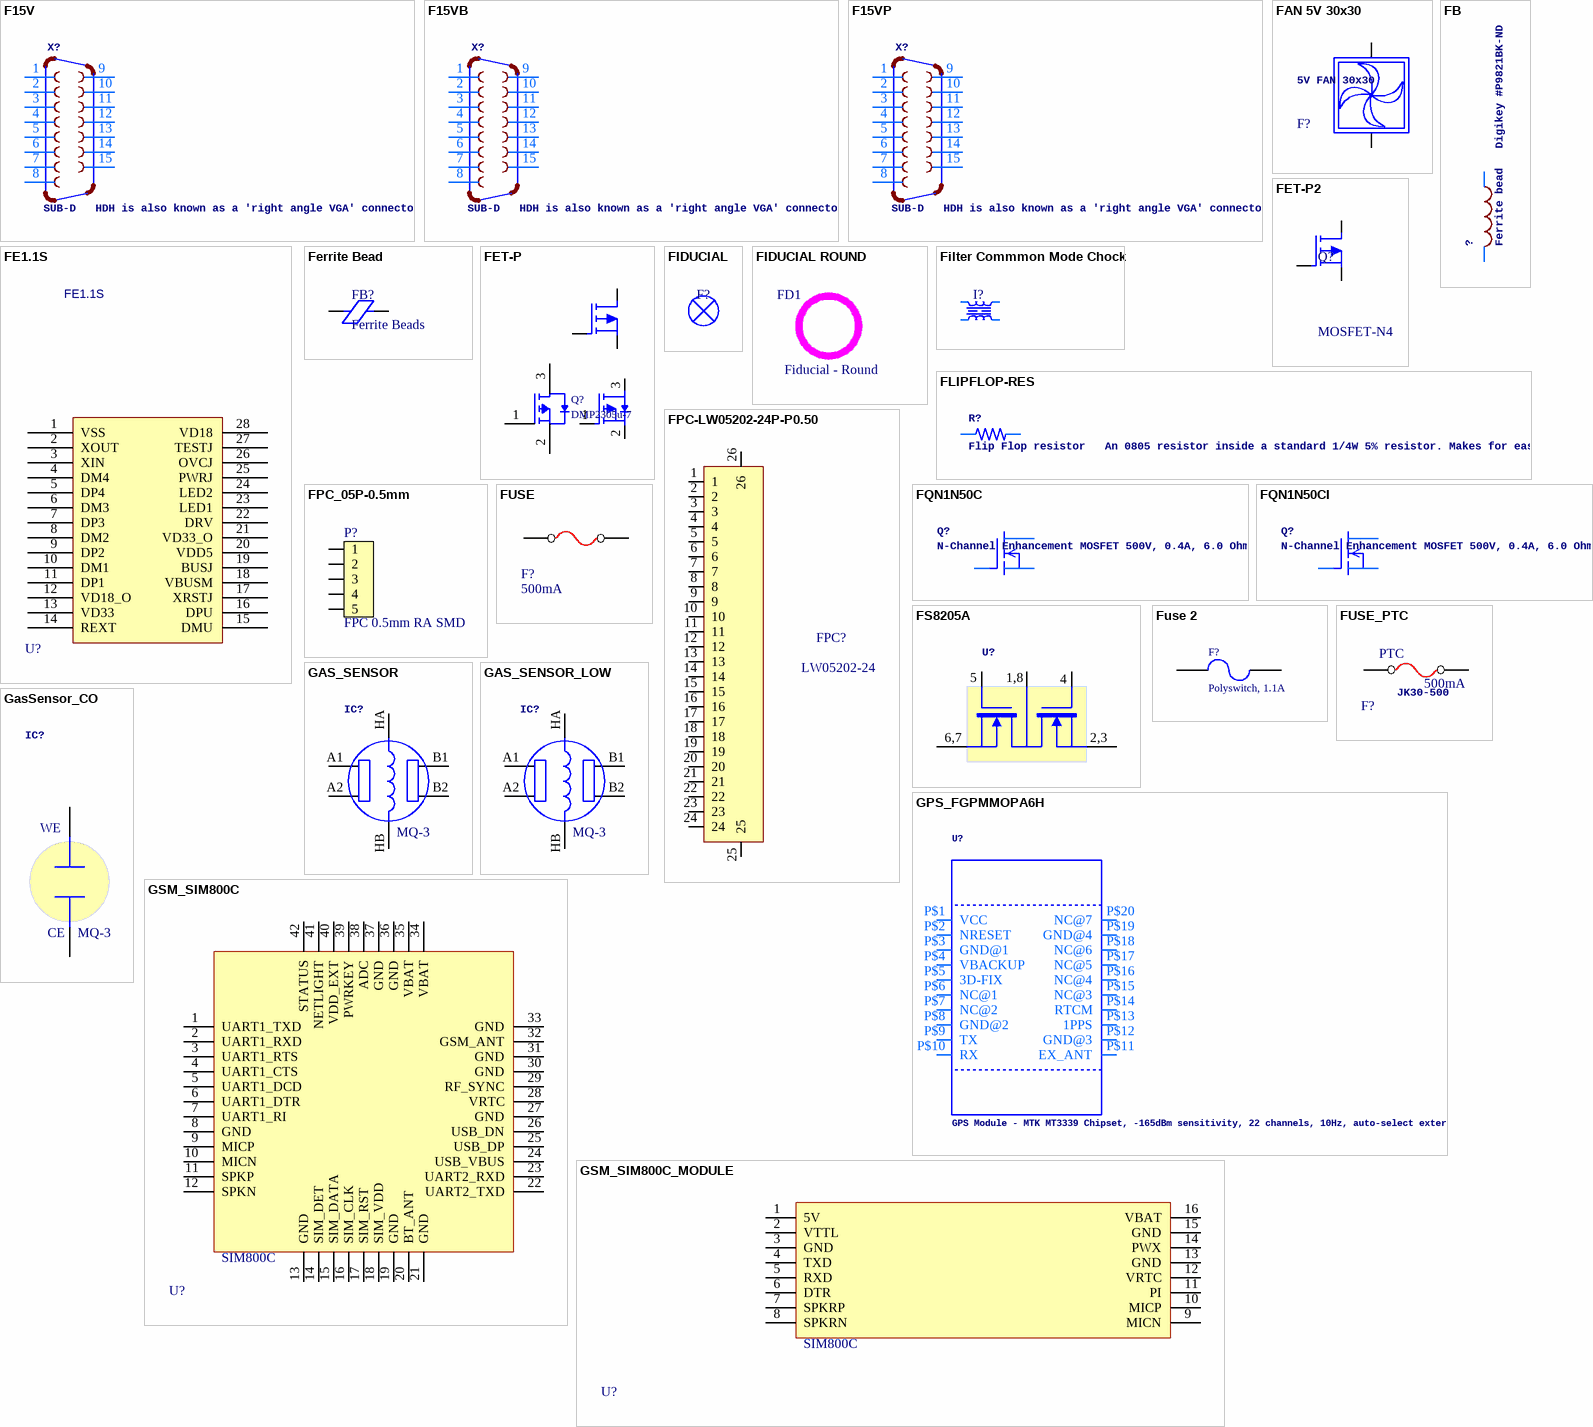
[diagram p11: symbols F15V to GSM_SIM800C_MODULE]

## F15V
designator X?, comment SUB-D   HDH is also known as a 'right angle VGA' connector
footprint F15V
pins: 1, 2, 3, 4, 5, 6, 7, 8, 9, 10, 11, 12, 13, 14, 15

## F15VB
designator X?, comment SUB-D   HDH is also known as a 'right angle VGA' connector
footprint F15VB
pins: 1, 2, 3, 4, 5, 6, 7, 8, 9, 10, 11, 12, 13, 14, 15

## F15VP
designator X?, comment SUB-D   HDH is also known as a 'right angle VGA' connector
footprint F15VP
pins: 1, 2, 3, 4, 5, 6, 7, 8, 9, 10, 11, 12, 13, 14, 15

## FAN 5V 30x30
designator F?, comment 5V FAN 30x30
RaspberryPi Fan 5V 30x30
footprint JST-2-PTH-THM - VERTICAL
pins: 1, 2

## FB
designator ?, comment Ferrite bead   Digikey #P9821BK-ND
footprint FB
pins: P$1 1, P$2 2

## FE1.1S
designator U?
USB HUB 2.0, 4 Channel; Manufacturer: TERMINUS; Manufacturer Part: FE1.1S-BSOP28BCN; Supplier: LCSC; Supplier Part: C9359; JLCPCB Part Class: Extended Part; link: https://lcsc.com/eda_search?q=C9359&%26type=1&ref=editor; spicePre: U; spiceSymbolName: FE1.1S
footprint SSOP-28_L9.9-W3.9-P0.64-LS6.0-BL-1
pins: 1 VSS, 2 XOUT, 3 XIN, 4 DM4, 5 DP4, 6 DM3, 7 DP3, 8 DM2, 9 DP2, 10 DM1, 11 DP1, 12 VD18_O, 13 VD33, 14 REXT, 15 DMU, 16 DPU, 17 XRSTJ, 18 VBUSM, 19 BUSJ, 20 VDD5, 21 VD33_O, 22 DRV, 23 LED1, 24 LED2, 25 PWRJ, 26 OVCJ, 27 TESTJ, 28 VD18

## Ferrite Bead
designator FB?, comment Ferrite Beads
footprint INDC-0805
footprint INDC1005X04L
footprint INDC1608X06L
footprint INDC-0603
footprint INDC-0402
footprint INDC-0805-NO
pins: 1, 2

## FET-P
designator Q?, comment DMP2305u-7
P Channel Mosfet
pins: 1 "Gate", 1 G, 1 G, 2 "Source", 2 S, 2 D, 3 "Drain", 3 D, 4 S

## FET-P2
designator Q?, comment MOSFET-N4
N-Channel MOSFET, Externally Terminated Substrate; Published: 24-Mar-1999; LatestRevisionDate: 29-May-2009; LatestRevisionNote: IPC-7351 Footprint Added.; PackageVersion: Sep-2000; PackageReference: SOT-343; Publisher: Altium Limited; PackageDescription: 4-Pin SOT-343 Package 1.3 mm Pitch, 2.1 mm Lead Span
footprint SOT-343_N (SOT343, 4-Leads, Body 2x1.3 mm, Pitch 1.3mm, Lead Span 2.1mm, IPC Medium Density)
footprint SOT-343_L (SOT343, 4-Leads, Body 2x1.3 mm, Pitch 1.3mm, Lead Span 2.1mm, IPC High Density)
footprint SOT-343_M (SOT343, 4-Leads, Body 2x1.3 mm, Pitch 1.3mm, Lead Span 2.1mm, IPC Low Density)
simulation model NMOS (MOSFET-N)
pins: 1 G, 2 D, 4 S

## FIDUCIAL
designator F?, comment For use by pick and place machines to calibrate the vision/machine, 1mm  (value not drawn)
Fiducial Mark
footprint FIDUCIAL_1MM
footprint Fiducial

## FIDUCIAL ROUND
designator FD1, comment Fiducial - Round
Fiducial - Round 1.5mm Top-Bottom; Status: Unreleased; Category: Fiducial
footprint Fiducial

## Filter Commmon Mode Chock
designator I?  (value not drawn)
footprint filter
pins: 1, 2, 3 2, 4 3

## FLIPFLOP-RES
designator R?, comment Flip Flop resistor   An 0805 resistor inside a standard 1/4W 5% resistor. Makes for easy mods
footprint 0805-THM
pins: 1, 2

## FPC-LW05202-24P-P0.50
designator FPC?, comment LW05202-24
Manufacturer: MINTRON(明硕); Add into BOM: yes; Locking Feature: 抽屉式; Number of Contacts: 24P; Pitch: 0.5mm; FFC, FCB Thickness: 0.3mm; Symbol: LW05202-24; Device: LW05202-24; LCSC Part Name: 间距:0.5mm P数:24P 抽屉式 下接; Supplier Part: C375920; Manufacturer Part: LW05202-24; Supplier Footprint: SMD,P=0.5mm,卧贴; JLCPCB Part Class: Extended Part; Datasheet: https://atta.szlcsc.com/upload/public/pdf/source/20190322/C375926_97FD0B8889EE24B4FE9B3A29C1023ADE.pdf; Supplier: LCSC; Convert to PCB: yes; Contact Type: Bottom Contact; Mounting Type: 卧贴; Height Above Board: 2mm
footprint FPC-SMD_24P-P0.50_LW05202-24
3D model FPC-SMD_24P-P0.50_L17.6-W5.2-H2.0-LW05202-24
pins: 1, 2, 3, 4, 5, 6, 7, 8, 9, 10, 11, 12, 13, 14, 15, 16, 17, 18, 19, 20, 21, 22, 23, 24, 25, 26

## FPC_05P-0.5mm
designator P?, comment FPC 0.5mm RA SMD
0.5mm FPC, 5P,Right Angle SMT,Double Contact,H=1.2mm,White, Tin plated; Part Number: FPC_05P-0.5mm-RA-SMD; Manufacturer: W-CON; Manufacturer Part Number: 5141-05RZDNWR01; 2nd source part number: WM9836CT-ND; Artikkelnr Noca: 55010020; Artikkelnr Simpro: N.A.; Datasheet: \\hizz\pro\app9717\Datasheet\connectores\W-CON\5141-XXRZDNXX0X.pdf; Footprint Doc: FPC_05P-0.5mm-RA-SMD; LatestRevisionDate: 2016-04-21; Pin Count: 7; Publisher: Nordic Semiconductor; Published: 2015-06-22; Value: FPC 0.5mm RA SMD; Note: *; Supplier: Cabcon; Supplier part number: 5141-05RZDNWR01; 2nd source Supplier: Digi-Key
footprint FPC_05P-0.5mm-RA-SMD
pins: 1, 2, 3 (power), 4 (power), 5 (power)

## FQN1N50C
designator Q?, comment N-Channel Enhancement MOSFET 500V, 0.4A, 6.0 Ohm
footprint TO92
pins: 1 G, 2 D, 3 S

## FQN1N50CI
designator Q?, comment N-Channel Enhancement MOSFET 500V, 0.4A, 6.0 Ohm
footprint TO92-INLINE
pins: 1 D, 2 G, 3 S

## FS8205A
designator U?
footprint TSSOP-8
pins: 1 D12, 2 S1, 3 S1 (power), 4 G1 (power), 5 G2 (power), 6 S2, 7 S2, 8 D12
text: 1,8; 6,7; 2,3

## FUSE
designator F?  value 500mA
footprint 0411V
footprint FUSE
footprint FUSE - Long
footprint 0207/2V
footprint Fuse-SMD
footprint 1812
footprint R1206-NO
pins: 1, 2

## Fuse 2
designator F?, comment Polyswitch, 1.1A
Polyswitch 1.1A, Raychem RUE110; Revision: July-2002: Re-released for DXP Platform.; Supplier: FARNELL; Supplier Code: 608-907
footprint PIN-W2/E2.8 (Fuse; 2 Leads)
simulation model FUSE (Spice Subcircuit)
footprint RUE160_0.2
3D model PolySwitch2 (PCB3D Model)
pins: 1, 2

## FUSE_PTC
designator F?, comment JK30-500  value 500mA
Resetable PTC fuse
footprint FUSE-TH_L14.0-W3.0-P10.20-D1.2-S1.2
pins: 1, 2
text: PTC

## GAS_SENSOR
designator IC?, comment TIMERChanged DIP package to have round (not oval) pin pads    http://www.ladyada.net/library/pcb/eaglelibrary.html  (value not drawn)
footprint MQ-3
pins: A1, A2, B1, B2, HA H1, HB H1 (power)
text: MQ-3

## GAS_SENSOR_LOW
designator IC?, comment TIMERChanged DIP package to have round (not oval) pin pads    http://www.ladyada.net/library/pcb/eaglelibrary.html  (value not drawn)
footprint MQ-7
pins: A1, A2, B1, B2, HA H1, HB H1 (power)
text: MQ-3

## GasSensor_CO
designator IC?, comment TIMERChanged DIP package to have round (not oval) pin pads    http://www.ladyada.net/library/pcb/eaglelibrary.html  (value not drawn)
footprint ME2
pins: C H1, W H1 (power)
text: WE; CE; MQ-3

## GPS_FGPMMOPA6H
designator U?, comment GPS Module - MTK MT3339 Chipset, -165dBm sensitivity, 22 channels, 10Hz, auto-select external antenna options
footprint FGPMMOPA6H
pins: P$1 VCC, P$2 NRESET, P$3 GND@1, P$4 VBACKUP, P$5 3D-FIX, P$6 NC@1, P$7 NC@2, P$8 GND@2, P$9 TX, P$10 RX, P$11 EX_ANT, P$12 GND@3, P$13 1PPS, P$14 RTCM, P$15 NC@3, P$16 NC@4, P$17 NC@5, P$18 NC@6, P$19 GND@4, P$20 NC@7

## GSM_SIM800C
designator U?, comment DeviceName: SIM800C  (hidden comment: SIM800C GSM/GPRS Module)
GateName_1: G$1; SymbolName_1: SIM900_LITERAL; DeviceSetName: GSM_SIM900_LITERAL; LibraryName: microbuilder; Package: SIM900_SMT; Parameter 1: *
footprint SIM800C
pins: 1 UART1_TXD, 2 UART1_RXD, 3 UART1_RTS, 4 UART1_CTS, 5 UART1_DCD, 6 UART1_DTR, 7 UART1_RI, 8 GND, 9 MICP, 10 MICN, 11 SPKP, 12 SPKN (power), 13 GND (power), 14 SIM_DET, 15 SIM_DATA, 16 SIM_CLK, 17 SIM_RST, 18 SIM_VDD, 19 GND, 20 BT_ANT, 21 GND, 22 UART2_TXD, 23 UART2_RXD, 24 USB_VBUS, 25 USB_DP, 26 USB_DN (power), 27 GND, 28 VRTC, 29 RF_SYNC, 30 GND, 31 GND, 32 GSM_ANT, 33 GND (power), 34 VBAT, 35 VBAT, 36 GND (power), 37 GND (power), 38 ADC (power), 39 PWRKEY (power), 40 VDD_EXT (power), 41 NETLIGHT (power), 42 STATUS